# Altium footprint library PCB_Lib_Devzone.PcbLib: 491 footprints (part 12 of 31)
Each footprint in its own frame and in the unit in brackets; x right, y up, seen from the top. Pads: shape width x height; smd on the part's side, far side on the other; paste and mask are expansions set on the pad; w line width, h text height; cw(c..) or ccw(c..) is an arc to the next point about the centre after c.
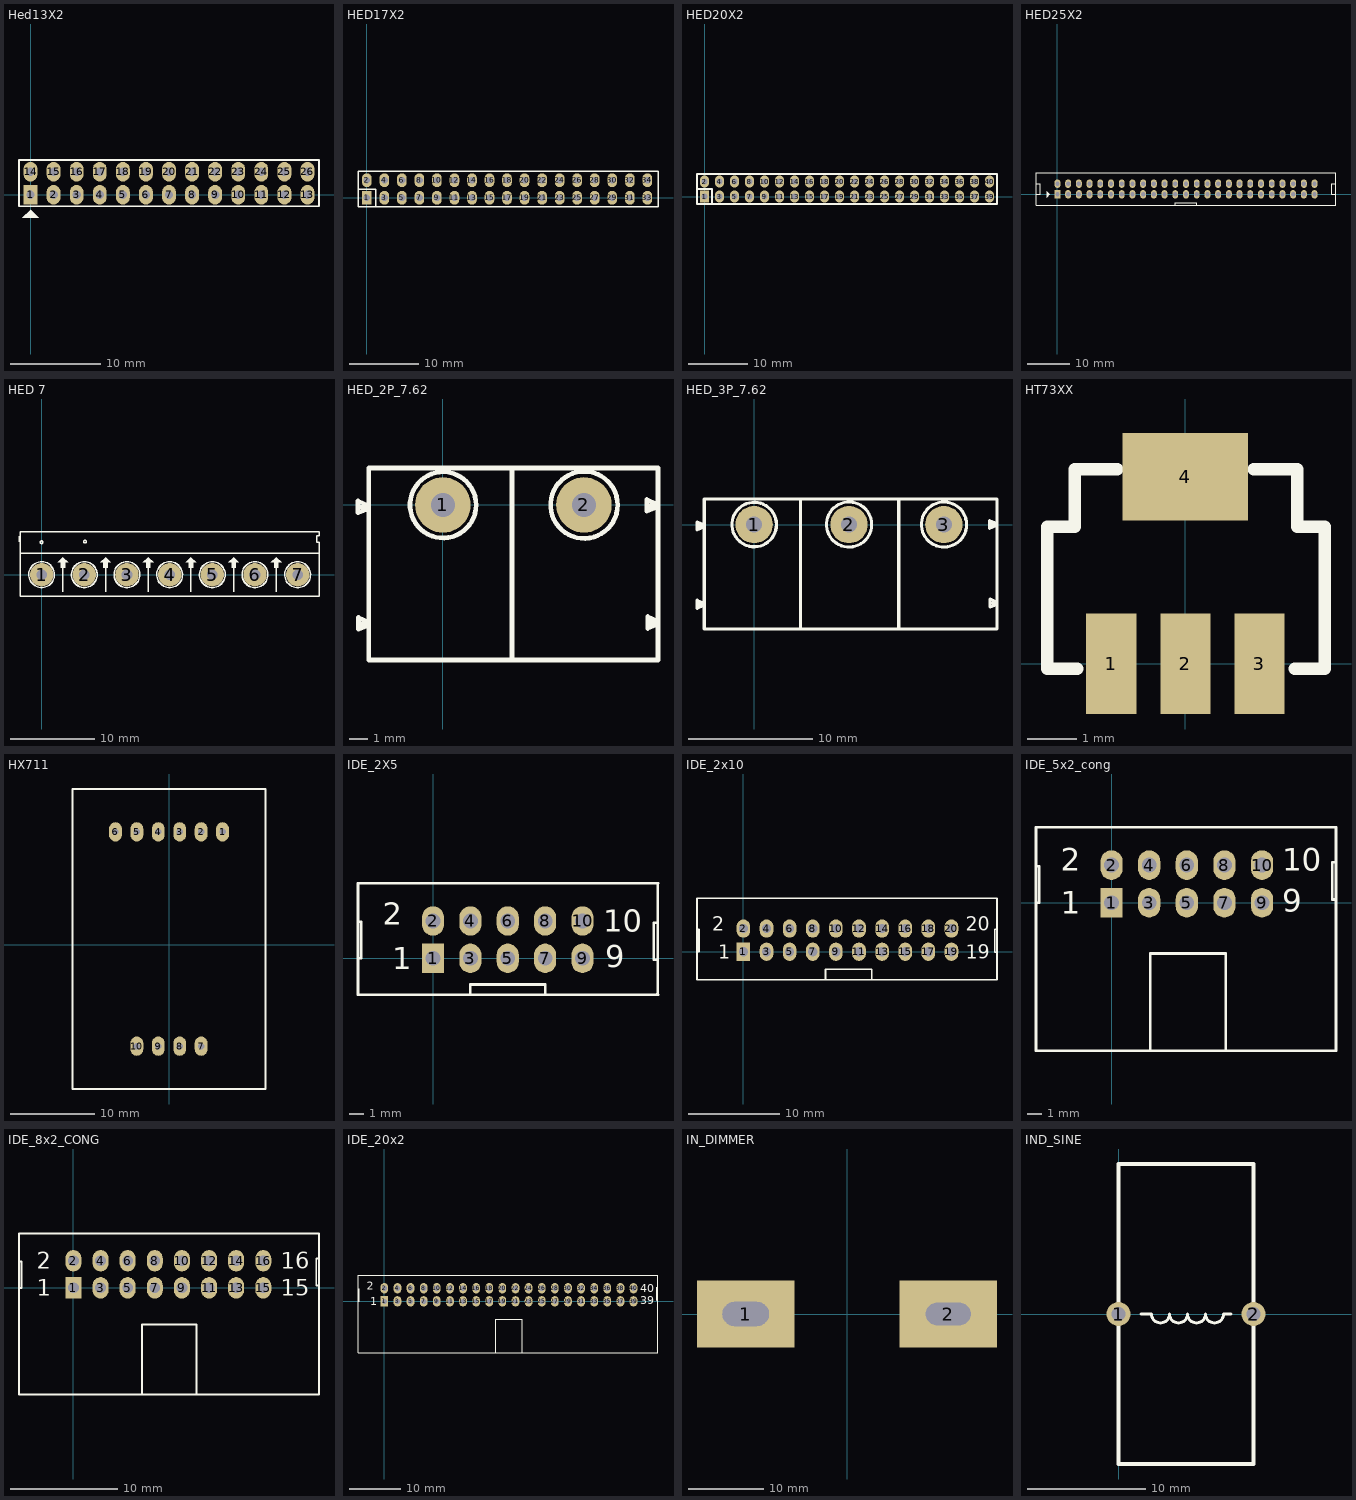
[diagram p11: the footprints below, top view; thin cyan lines are the x and y axes]

## Hed13X2 [mil] "Header 13x2,26 pin, connecter"
pads (26):
  rect 60x85 hole 36: 1(0,0)
  oval 60x85 hole 36: 2(100,0) 3(200,0) 4(300,0) 5(400,0) 6(500,0) 7(600,0) 8(700,0) 9(800,0) 10(900,0) 11(1000,0) 12(1100,0) 13(1200,0) 14(0,100) 15(100,100) 16(200,100) 17(300,100) 18(400,100) 19(500,100) 20(600,100) 21(700,100) 22(800,100) 23(900,100) 24(1000,100) 25(1100,100) 26(1200,100)
Top Overlay:
  region: 0,-65 -35,-100 35,-100
  lines w8: -50,-50 1250,-50 1250,150 -50,150 -50,-50

## HED17X2 [mm]
pads (34):
  rect 1.4x2 hole 1: 1(0,0)
  oval 1.4x2 hole 1: 2(0,2.54) 3(2.54,0) 4(2.54,2.54) 5(5.08,0) 6(5.08,2.54) 7(7.62,0) 8(7.62,2.54) 9(10.16,0) 10(10.16,2.54) 11(12.7,0) 12(12.7,2.54) 13(15.24,0) 14(15.24,2.54) 15(17.78,0) 16(17.78,2.54) 17(20.32,0) 18(20.32,2.54) 19(22.86,0) 20(22.86,2.54) 21(25.4,0) 22(25.4,2.54) 23(27.94,0) 24(27.94,2.54) 25(30.48,0) 26(30.48,2.54) 27(33.02,0) 28(33.02,2.54) 29(35.56,0) 30(35.56,2.54) 31(38.1,0) 32(38.1,2.54) 33(40.64,0) 34(40.64,2.54)
Top Overlay:
  lines w0.203: -1.27,1.27 1.27,1.27 1.27,-1.27 ; -1.27,-1.27 -1.27,3.81 42.189,3.81 42.189,-1.27 -1.27,-1.27

## HED20X2 [mm]
pads (40):
  rect 1.6x2 hole 1: 1(0,0)
  oval 1.6x2 hole 1: 2(0,2.54) 3(2.54,0) 4(2.54,2.54) 5(5.08,0) 6(5.08,2.54) 7(7.62,0) 8(7.62,2.54) 9(10.16,0) 10(10.16,2.54) 11(12.7,0) 12(12.7,2.54) 13(15.24,0) 14(15.24,2.54) 15(17.78,0) 16(17.78,2.54) 17(20.32,0) 18(20.32,2.54) 19(22.86,0) 20(22.86,2.54) 21(25.4,0) 22(25.4,2.54) 23(27.94,0) 24(27.94,2.54) 25(30.48,0) 26(30.48,2.54) 27(33.02,0) 28(33.02,2.54) 29(35.56,0) 30(35.56,2.54) 31(38.1,0) 32(38.1,2.54) 33(40.64,0) 34(40.64,2.54) 35(43.18,0) 36(43.18,2.54) 37(45.72,0) 38(45.72,2.54) 39(48.26,0) 40(48.26,2.54)
Top Overlay:
  lines w0.305: -1.27,1.27 1.27,1.27 1.27,-1.27 ; -1.27,-1.27 49.53,-1.27 49.53,3.81 -1.27,3.81 -1.27,-1.27

## HED25X2 [mm]
pads (50):
  rect 1.4x2 hole 1: 1(0,0)
  oval 1.4x2 hole 1: 2(0,2.54) 3(2.54,0) 4(2.54,2.54) 5(5.08,0) 6(5.08,2.54) 7(7.62,0) 8(7.62,2.54) 9(10.16,0) 10(10.16,2.54) 11(12.7,0) 12(12.7,2.54) 13(15.24,0) 14(15.24,2.54) 15(17.78,0) 16(17.78,2.54) 17(20.32,0) 18(20.32,2.54) 19(22.86,0) 20(22.86,2.54) 21(25.4,0) 22(25.4,2.54) 23(27.94,0) 24(27.94,2.54) 25(30.48,0) 26(30.48,2.54) 27(33.02,0) 28(33.02,2.54) 29(35.56,0) 30(35.56,2.54) 31(38.1,0) 32(38.1,2.54) 33(40.64,0) 34(40.64,2.54) 35(43.18,0) 36(43.18,2.54) 37(45.72,0) 38(45.72,2.54) 39(48.26,0) 40(48.26,2.54) 41(50.8,0) 42(50.8,2.54) 43(53.34,0) 44(53.34,2.54) 45(55.88,0) 46(55.88,2.54) 47(58.42,0) 48(58.42,2.54) 49(60.96,0) 50(60.96,2.54)
Top Overlay:
  region: -2.565,0.749 -2.565,-0.8 -1.778,-0.013
  lines w0.203: -5.055,0.025 -4.089,0.025 -4.089,2.54 -5.055,2.54 ; 27.915,-2.489 27.915,-2.032 33.02,-2.032 33.045,-2.007 33.045,-2.54 ; 66.015,5.08 -5.08,5.08 -5.08,-2.54 66.04,-2.54 66.04,-2.515 66.04,5.08 ; 66.04,0.025 65.075,0.025 65.075,2.54 66.04,2.54

## HED 7 [mil]
pads (7):
  round 110 hole 50: 1(0,0) 2(200,0) 3(400,0) 4(600,0) 5(800,0) 6(1000,0) 7(1200,0)
Top Overlay:
  circle w7: c203.6,155 r6.4
  circle w7: c0,152 r6.4
  region: 300,82.5 275,57.5 290,57.5 290,32.5 310,32.5 310,57.5 325,57.5
  region: 700,82.5 675,57.5 690,57.5 690,32.5 710,32.5 710,57.5 725,57.5
  region: 1100,82.5 1075,57.5 1090,57.5 1090,32.5 1110,32.5 1110,57.5 1125,57.5
  region: 900,82.5 875,57.5 890,57.5 890,32.5 910,32.5 910,57.5 925,57.5
  region: 500,82.5 475,57.5 490,57.5 490,32.5 510,32.5 510,57.5 525,57.5
  region: 100,82.5 75,57.5 90,57.5 90,32.5 110,32.5 110,57.5 125,57.5
  lines w7: -106,155 -106,180 ; -100,100 1300,100 ; 39.44,45.71 ccw(c0,0) 39.62,45.56 ; 100,-81 100,70 ; 238.89,46.18 ccw(c200,0) 239.04,46.05 ; 239.44,45.71 ccw(c200,0) 239.62,45.56 ; 300,-81 300,70 ; 438.89,46.18 ccw(c400,0) 439.04,46.05 ; 439.44,45.71 ccw(c400,0) 439.62,45.56 ; 500,-81 500,70 ; 638.89,46.18 ccw(c600,0) 639.04,46.05 ; 639.44,45.71 ccw(c600,0) 639.62,45.56 ; 700,-81 700,70 ; 838.89,46.18 ccw(c800,0) 839.04,46.05 ; 839.44,45.71 ccw(c800,0) 839.62,45.56 ; 900,-81 900,70 ; 1038.89,46.18 ccw(c1000,0) 1039.04,46.05 ; 1039.44,45.71 ccw(c1000,0) 1039.62,45.56 ; 1100,-81 1100,70 ; 1238.89,46.18 ccw(c1200,0) 1239.04,46.05 ; -100,-100 -100,50 -100,200 1300,200 1300,182 1289,182 1289,151 1300,151 1300,-100 -100,-100
3D body "SW3dPS-KRM2.STEP": height 403.7, standoff -147.48, extent 103.3,-100 497,195.28
3D body "SW3dPS-KRM2.STEP": height 403.7, standoff -147.48, extent 503.3,-100 897,195.28
3D body "SW3dPS-KRM2.STEP": height 403.7, standoff -147.48, extent 903.3,-100 1297,195.28
3D body "SW3dPS-KRM2.STEP": height 403.7, standoff -147.48, extent 703.3,-100 1097,195.28
3D body "SW3dPS-KRM2.STEP": height 403.7, standoff -147.48, extent 303.3,-100 697,195.28
3D body "SW3dPS-KRM2.STEP": height 403.7, standoff -147.48, extent -96.7,-100 297,195.28

## HED_2P_7.62 [mm]
pads (2):
  round 3 hole 1.3: 1(0,0) 2(7.62,0)
Top Overlay:
  circle w0.254: c7.628,0 r1.811
  circle w0.254: c0.008,0 r1.786
  lines w0.254: -4.587,-0.104 -4.242,-0.127 -4.105,-0.007 -4.587,0.216 -4.587,-0.424 -4.054,-0.21 ; -4.562,-6.403 -4.216,-6.426 -4.079,-6.306 -4.562,-6.084 -4.562,-6.723 -4.029,-6.509 ; 3.632,1.956 3.734,1.956 3.734,-8.382 ; 11.008,-0.028 11.354,-0.051 11.491,0.069 11.008,0.292 11.008,-0.347 11.542,-0.134 ; 11.059,-6.352 11.405,-6.375 11.542,-6.255 11.059,-6.033 11.059,-6.672 11.592,-6.459 ; -4,-8.382 0,-8.382 11.62,-8.382 11.62,-5.182 11.62,2 -4,2 -4,-5.182 -4,-8.382

## HED_3P_7.62 [mm]
pads (3):
  round 3 hole 1.3: 1(0,0) 2(7.62,0) 3(15.24,0)
Top Overlay:
  circle w0.254: c7.628,0 r1.811
  circle w0.254: c0.008,0 r1.786
  circle w0.254: c15.248,0 r1.811
  lines w0.254: -4.587,-0.104 -4.242,-0.127 -4.105,-0.007 -4.587,0.216 -4.587,-0.424 -4.054,-0.21 ; -4.562,-6.403 -4.216,-6.426 -4.079,-6.306 -4.562,-6.084 -4.562,-6.723 -4.029,-6.509 ; -4,2 -4,-5.182 -4,-8.382 0,-8.382 11.62,-8.382 11.62,2 ; -4,2.044 19.506,2.044 19.506,-8.382 7.886,-8.382 ; 3.734,-8.382 3.734,1.956 ; 18.894,0.016 19.24,-0.007 19.377,0.113 18.894,0.336 18.894,-0.303 19.428,-0.09 ; 18.945,-6.308 19.291,-6.331 19.428,-6.211 18.945,-5.989 18.945,-6.628 19.479,-6.414

## HT73XX [mil]
pads (4):
  rect 40x80 smd: 1(-59,0) 2(0,0) 3(59,0)
  rect 100x70 smd: 4(0,149)
Top Overlay:
  lines w10: -86,-4 -110,-4 -110,109 -88,109 -88,155 -54.25,155 ; 54.5,155 89,155 89,109 111,109 111,-4 87,-4

## HX711 [mil]
pads (10):
  oval 60x90 hole 30: 1(249,527) 2(149,527) 3(49,527) 4(-51,527) 5(-151,527) 6(-251,527) 7(149,-473) 8(49,-473) 9(-51,-473) 10(-151,-473)
Top Overlay:
  lines w10: -451,-673 449,-673 449,727 -451,727 -451,-673

## IDE_2X5 [mm] "Header 10x2,20 pin, connecter"
height 7.62
pads (10):
  rect 1.5x2 hole 1: 1(0,0)
  oval 1.5x2 hole 1: 2(0,2.54) 3(2.54,0) 4(2.54,2.54) 5(5.08,0) 6(5.08,2.54) 7(7.62,0) 8(7.62,2.54) 9(10.16,0) 10(10.16,2.54)
Top Overlay:
  lines w0.178: -5.1,-0.025 -5.075,0 -4.875,0 -4.875,2.475 -5.1,2.475 ; 2.525,-2.438 2.525,-1.778 7.625,-1.778 7.625,-2.464 ; 15.203,-2.45 15.265,-2.388 ; 15.265,-0.102 15.011,-0.102 15.011,2.423 15.265,2.423 ; 15.291,-2.475 -5.1,-2.475 -5.1,5.1 ; -5.1,5.1 15.291,5.1 -5.1,5.1 ; 15.265,-2.388 15.265,5.105 15.265,-2.388
  text "10" at 11.582,1.803 h1.52
  text "9" at 11.709,-0.61 h1.52
  text "2" at -3.429,2.286 h1.52
  text "1" at -2.775,-0.75 h1.52
3D body "User Library-IDC Socket Male 10pin Straight THT Goldplated 2_54mm.STEP": height 9.17, standoff -3.23, extent -5.07,-2.98 15.23,5.87

## IDE_2x10 [mm]
pads (20):
  rect 1.5x2 hole 1: 1(0,0)
  oval 1.5x2 hole 1: 2(0,2.54) 3(2.54,0) 4(2.54,2.54) 5(5.08,0) 6(5.08,2.54) 7(7.62,0) 8(7.62,2.54) 9(10.16,0) 10(10.16,2.54) 11(12.7,0) 12(12.7,2.54) 13(15.24,0) 14(15.24,2.54) 15(17.78,0) 16(17.78,2.54) 17(20.32,0) 18(20.32,2.54) 19(22.86,0) 20(22.86,2.54)
Top Overlay:
  lines w0.178: -5.1,-0.025 -5.075,0 -4.875,0 -4.875,2.475 -5.1,2.475 ; 9.017,-3.099 9.017,-1.93 14.117,-1.93 14.117,-3.073 ; 27.854,-0.05 27.6,-0.05 27.6,2.475 27.854,2.475 ; -5.1,-3.099 27.864,-3.099 27.864,5.893 -5.1,5.893 -5.1,-3.099
  text "20" at 24.435,2.286 h1.52
  text "19" at 24.435,-0.75 h1.52
  text "1" at -2.775,-0.75 h1.52
  text "2" at -3.429,2.286 h1.52
3D body "User Library-IDC Socket Male 20pin Straight THT Goldplated 2_54mm.STEP": height 9.13, standoff -3.27, extent -5.07,-3.023 27.93,5.827

## IDE_5x2_cong [mm]
pads (10):
  rect 1.5x2 hole 1: 1(0,0)
  oval 1.5x2 hole 1: 2(0,2.54) 3(2.54,0) 4(2.54,2.54) 5(5.08,0) 6(5.08,2.54) 7(7.62,0) 8(7.62,2.54) 9(10.16,0) 10(10.16,2.54)
Top Overlay:
  lines w0.178: -5.1,-0.025 -5.075,0 -4.875,0 -4.875,2.475 -5.1,2.475 ; 2.616,-9.906 2.616,-3.429 7.716,-3.429 7.716,-10 7.493,-10 ; 15.113,5.1 -5.1,5.1 -5.1,-10 15.146,-10 15.154,-9.992 15.154,-2.424 15.154,2.423 15.154,5.105 ; 15.154,0.218 14.9,0.218 14.9,2.743 15.154,2.743
  text "2" at -3.429,2.159 h1.52
  text "1" at -3.429,-0.75 h1.52
  text "9" at 11.532,-0.61 h1.52
  text "10" at 11.532,2.159 h1.52

## IDE_8x2_CONG [mm]
pads (16):
  rect 1.5x2 hole 1: 1(0,0)
  oval 1.5x2 hole 1: 2(0,2.54) 3(2.54,0) 4(2.54,2.54) 5(5.08,0) 6(5.08,2.54) 7(7.62,0) 8(7.62,2.54) 9(10.16,0) 10(10.16,2.54) 11(12.7,0) 12(12.7,2.54) 13(15.24,0) 14(15.24,2.54) 15(17.78,0) 16(17.78,2.54)
Top Overlay:
  lines w0.178: -5.1,-0.025 -5.075,0 -4.875,0 -4.875,2.475 -5.1,2.475 ; 6.426,-9.906 6.426,-3.429 11.526,-3.429 11.526,-10 ; 7.493,-10 7.716,-10 ; 23,0.213 22.746,0.213 22.746,2.738 23,2.738 ; -5.1,-10 15.146,-10 23,-10 23,-2.43 23,2.418 23,5.1 -5.1,5.1 -5.1,-10
  text "16" at 19.431,1.778 h1.52
  text "15" at 19.431,-0.762 h1.52
  text "1" at -3.429,-0.762 h1.52
  text "2" at -3.429,1.778 h1.52

## IDE_20x2 [mm]
pads (40):
  rect 1.5x2 hole 1: 1(0,0)
  oval 1.5x2 hole 1: 2(0,2.54) 3(2.54,0) 4(2.54,2.54) 5(5.08,0) 6(5.08,2.54) 7(7.62,0) 8(7.62,2.54) 9(10.16,0) 10(10.16,2.54) 11(12.7,0) 12(12.7,2.54) 13(15.24,0) 14(15.24,2.54) 15(17.78,0) 16(17.78,2.54) 17(20.32,0) 18(20.32,2.54) 19(22.86,0) 20(22.86,2.54) 21(25.4,0) 22(25.4,2.54) 23(27.94,0) 24(27.94,2.54) 25(30.48,0) 26(30.48,2.54) 27(33.02,0) 28(33.02,2.54) 29(35.56,0) 30(35.56,2.54) 31(38.1,0) 32(38.1,2.54) 33(40.64,0) 34(40.64,2.54) 35(43.18,0) 36(43.18,2.54) 37(45.72,0) 38(45.72,2.54) 39(48.26,0) 40(48.26,2.54)
Top Overlay:
  lines w0.178: -5.1,-0.025 -5.075,0 -4.875,0 -4.875,2.475 -5.1,2.475 ; 21.615,-9.906 21.615,-3.429 26.715,-3.429 26.715,-10 26.492,-10 ; 53,0.167 52.746,0.167 52.746,2.692 53,2.692 ; 53,5.055 53,2.373 53,-2.475 53,-10 12.432,-10 -5.1,-10 -5.1,5.1 53,5.1
  text "2" at -3.429,2.286 h1.52
  text "1" at -2.775,-0.75 h1.52
  text "39" at 49.581,-0.61 h1.52
  text "40" at 49.581,1.753 h1.52

## IN_DIMMER [mm]
pads (2):
  rect 13x9 hole 3.2 slot 6.2 at 0 deg: 1(-13.5,0)
  rect 13x9 hole 3 slot 6 at 0 deg: 2(13.5,0)

## IND_SINE [mil]
pads (2):
  round 80 hole 47.24: 1(0,0) 2(450,0)
Top Overlay:
  lines w10: 75,0 110,0 ccw(c140,0) 170,0 ccw(c200,0) 230,0 ccw(c260,0) 290,0 ccw(c320,0) 350,0 375,0
  lines w12: 0,-500 0,0 0,500 450,500 450,-500 0,-500